# Altium footprint library ICs And Semiconductors THD.PcbLib: 507 footprints (part 32 of 32)
Each footprint in its own frame and in the unit in brackets; x right, y up, seen from the top. Pads: shape width x height; smd on the part's side, far side on the other; paste and mask are expansions set on the pad; w line width, h text height; cw(c..) or ccw(c..) is an arc to the next point about the centre after c.
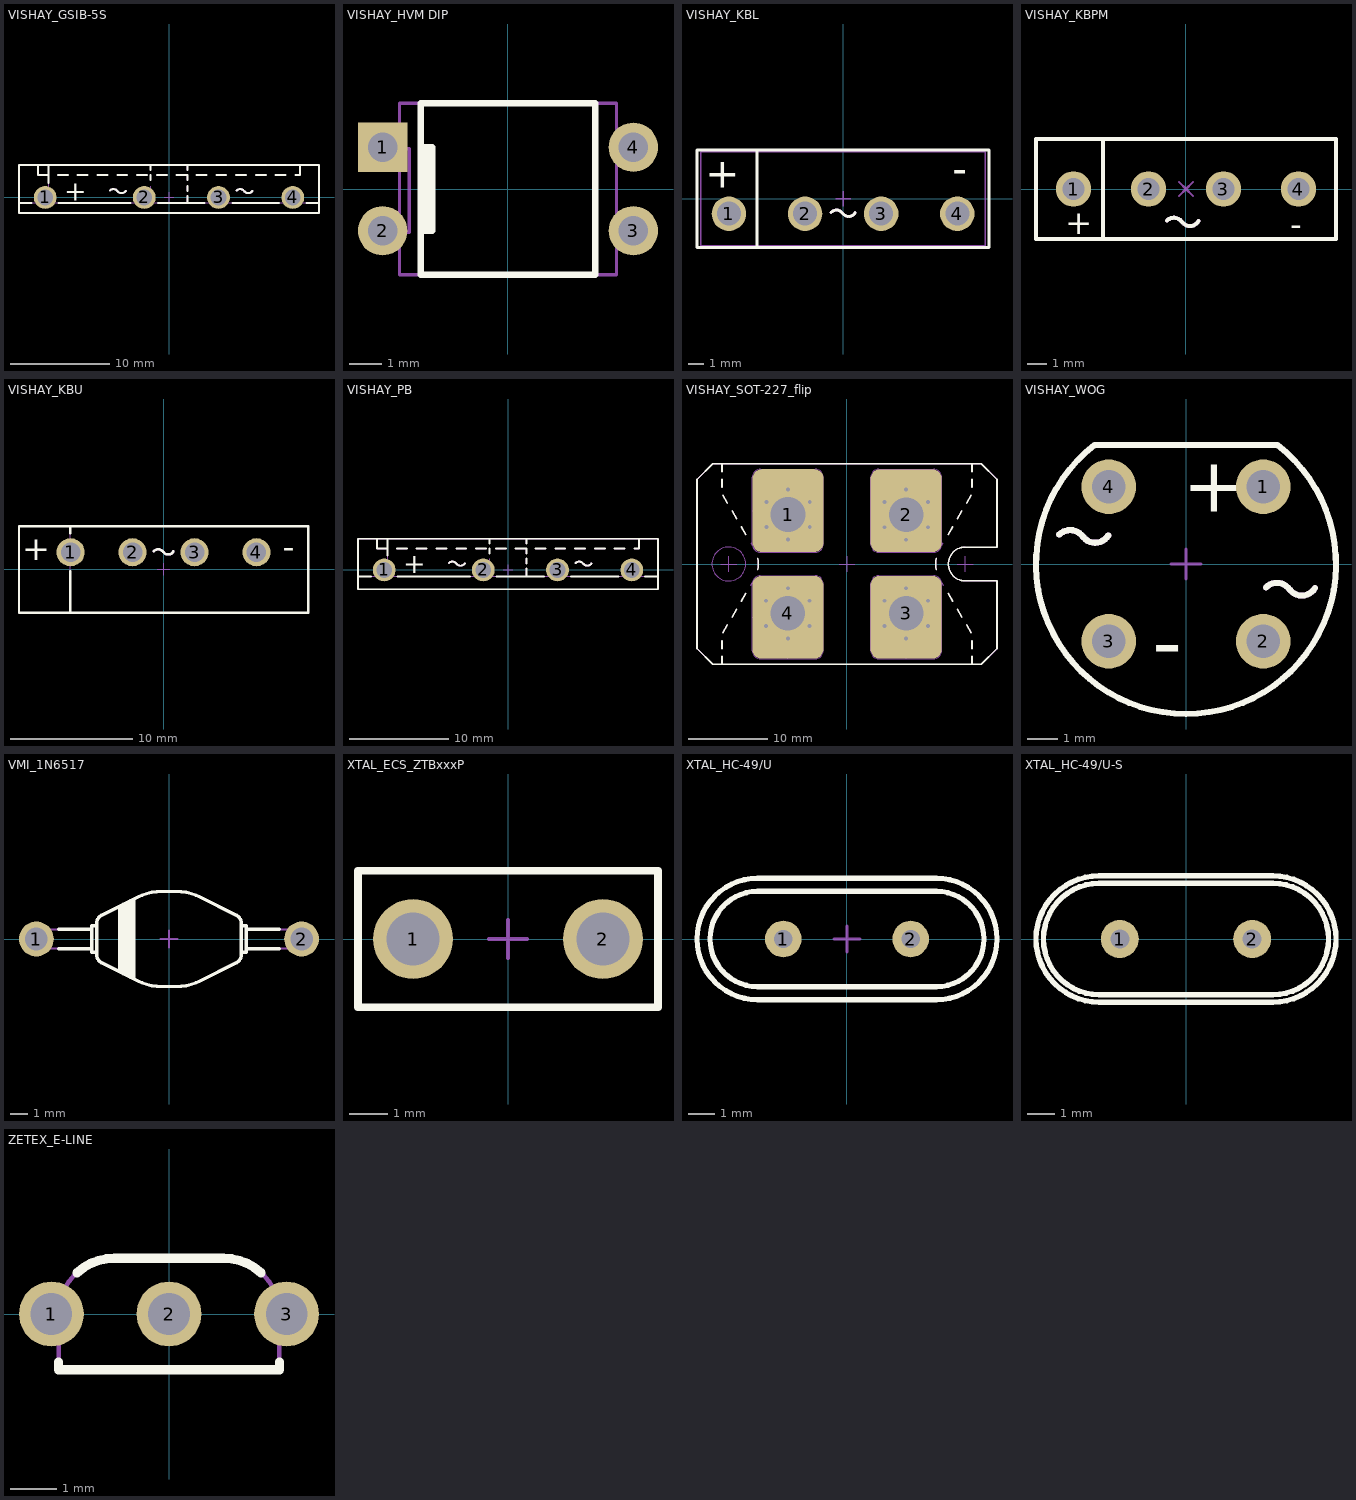
[diagram p31: the footprints below, top view; thin cyan lines are the x and y axes]

## VISHAY_GSIB-5S [mm] "Bridge Rectifier, Body 30mm x 4.8mm, VISHAY Case Type GSIB-5S"
height 24.5
pads (4):
  round 2.3 hole 1.6: 1(-12.5,0) 2(-2.5,0) 3(5,0) 4(12.5,0)
Top Overlay:
  lines w0.2: -15.15,-0.55 -13.896,-0.55 ; -13.22,3.25 -13.22,2.25 -12.22,2.25 ; -12.15,1.459 -12.15,3.25 ; -11.22,2.25 -10.22,2.25 ; -11.148,-0.55 -3.896,-0.55 ; -9.22,2.25 -8.22,2.25 ; -7.22,2.25 -6.22,2.25 ; -5.975,0.688 cw(c-5.615,0.341) -5.2,0.62 ; -5.22,2.25 -4.22,2.25 ; -5.175,0.6 ccw(c-4.794,0.923) -4.365,0.666 ; -3.22,2.25 -2.22,2.25 ; -1.85,1.75 -1.85,2.25 ; -1.85,2.75 -1.85,3.25 ; -1.22,2.25 -0.22,2.25 ; -1.104,-0.55 3.604,-0.55 ; 0.78,2.25 1.78,2.25 ; 1.85,-0.55 1.85,0.15 ; 1.85,0.65 1.85,1.15 ; 1.85,1.75 1.85,2.25 ; 1.85,2.75 1.85,3.25 ; 2.78,2.25 3.78,2.25 ; 4.78,2.25 5.78,2.25 ; 6.396,-0.55 11.104,-0.55 ; 6.78,2.25 7.78,2.25 ; 6.825,0.688 cw(c7.185,0.341) 7.6,0.62 ; 7.625,0.6 ccw(c8.006,0.923) 8.435,0.666 ; 8.78,2.25 9.78,2.25 ; 10.78,2.25 11.78,2.25 ; 12.78,2.25 13.22,2.25 13.22,3.25 ; 13.896,-0.55 15.15,-0.55 ; -15.15,-1.55 15.15,-1.55 15.15,3.25 0,3.25 -15.15,3.25 -15.15,-1.55
  text "+" at -10.575,-0.355 h2
Notvisible:
  lines w0.05: -13,0 -12.5,0 ; -12.5,-0.5 -12.5,0 ; -12.5,0.5 -12.5,0 ; -12,0 -12.5,0 ; -3,0 -2.5,0 ; -2.5,-0.5 -2.5,0 ; -2.5,0.5 -2.5,0 ; -2,0 -2.5,0 ; -0.5,0 0,0 ; 0,-0.5 0,0 ; 0,0.5 0,0 ; 0.5,0 0,0 ; 4.5,0 5,0 ; 5,-0.5 5,0 ; 5,0.5 5,0 ; 5.5,0 5,0 ; 12,0 12.5,0 ; 12.5,-0.5 12.5,0 ; 12.5,0.5 12.5,0 ; 13,0 12.5,0
Mechanical 14:
  lines w0.1: -15.15,-0.55 15.15,-0.55 ; -13.22,3.25 -13.22,2.25 -12.22,2.25 ; -12.15,-0.55 -12.15,3.25 ; -11.22,2.25 -10.22,2.25 ; -9.22,2.25 -8.22,2.25 ; -7.22,2.25 -6.22,2.25 ; -5.22,2.25 -4.22,2.25 ; -3.22,2.25 -2.22,2.25 ; -1.85,-0.55 -1.85,0.15 ; -1.85,0.65 -1.85,1.15 ; -1.85,1.75 -1.85,2.25 ; -1.85,2.75 -1.85,3.25 ; -1.22,2.25 -0.22,2.25 ; 0.78,2.25 1.78,2.25 ; 1.85,-0.55 1.85,0.15 ; 1.85,0.65 1.85,1.15 ; 1.85,1.75 1.85,2.25 ; 1.85,2.75 1.85,3.25 ; 2.78,2.25 3.78,2.25 ; 4.78,2.25 5.78,2.25 ; 6.78,2.25 7.78,2.25 ; 8.78,2.25 9.78,2.25 ; 10.78,2.25 11.78,2.25 ; 12.78,2.25 13.22,2.25 13.22,3.25 ; -15.15,-1.55 15.15,-1.55 15.15,3.25 0,3.25 -15.15,3.25 -15.15,-1.55
  lines w0.2: -5.975,0.688 cw(c-5.615,0.341) -5.2,0.62 ; -5.175,0.6 ccw(c-4.794,0.923) -4.365,0.666 ; 6.825,0.688 cw(c7.185,0.341) 7.6,0.62 ; 7.625,0.6 ccw(c8.006,0.923) 8.435,0.666
  text "+" at -10.575,-0.355 h2
3D body "VISHAY_GSIB-5S.stp": height 24.3, standoff -3.6, extent -15.15,-1.55 15.15,3.25

## VISHAY_HVM DIP [mm] "DIP 4 Leads, Row Spacing 7.62 mm; Pitch 2.54 mm"
height 4.57
pads (4):
  rect 1.5x1.5 hole 0.9: 1(-3.81,1.27)
  round 1.5 hole 0.9: 2(-3.81,-1.27) 3(3.81,-1.27) 4(3.81,1.27)
Top Overlay:
  lines w0.2: -2.4,-1.275 -2.4,1.265 ; -2.3,-1.275 -2.3,1.265 ; -2.3,-1.27 -2.51,-1.27 -2.51,1.27 -2.3,1.27 ; -2.65,-2.61 2.65,-2.61 2.65,2.61 -2.65,2.61 -2.65,-2.61
Mechanical 14:
  lines w0.1: -3.3,-1.315 -3,-1.315 -3,1.225 -3.3,1.225 ; -3.3,-2.61 -3.3,2.61 3.3,2.61 3.3,-2.61 -3.3,-2.61
3D body "VISHAY_HVM DIP.stp": height 4.57, standoff -3.3, extent -3.935,-2.54 3.935,2.54

## VISHAY_KBL [mm] "Single-Phase Bridge Rectifier, Body 19mm x 6.25mm x 16.3mm"
height 16.3
pads (4):
  round 2.3 hole 1.6: 1(-7.62,-1) 2(-2.54,-1) 3(2.54,-1) 4(7.62,-1)
Top Overlay:
  lines w0.2: -5.75,-3.248 -5.75,3.25 ; -0.8,-0.912 cw(c-0.44,-1.259) -0.025,-0.98 ; 0,-1 ccw(c0.381,-0.677) 0.81,-0.934 ; -9.75,-3.248 -9.75,3.252 9.75,3.252 9.75,-3.248 -9.75,-3.248
  text "-" at 8.27,2.55 h2
  text "+" at -6.895,2.425 h2
Notvisible:
  lines w0.1: -8.12,-1 -7.62,-1 ; -7.62,-1.5 -7.62,-1 ; -7.62,-0.5 -7.62,-1 ; -7.12,-1 -7.62,-1 ; -3.04,-1 -2.54,-1 ; -2.54,-1.5 -2.54,-1 ; -2.54,-0.5 -2.54,-1 ; -2.04,-1 -2.54,-1 ; -0.5,0 0,0 ; 0,-0.5 0,0 ; 0,0.5 0,0 ; 0.5,0 0,0 ; 2.04,-1 2.54,-1 ; 2.54,-1.5 2.54,-1 ; 2.54,-0.5 2.54,-1 ; 3.04,-1 2.54,-1 ; 7.12,-1 7.62,-1 ; 7.62,-1.5 7.62,-1 ; 7.62,-0.5 7.62,-1 ; 8.12,-1 7.62,-1 ; -9.5,-3.125 9.5,-3.125 9.5,3.125 -9.5,3.125 -9.5,-3.125
Mechanical 14:
  lines w0.1: -5.75,-3.248 -5.75,3.25 ; -9.75,-3.25 -9.75,3.25 9.75,3.25 9.75,-3.25 -9.75,-3.25
  lines w0.2: -0.8,-0.912 cw(c-0.44,-1.259) -0.025,-0.98 ; 0,-1 ccw(c0.381,-0.677) 0.81,-0.934
  text "-" at 8.27,2.55 h2
  text "+" at -6.895,2.425 h2
3D body "VISHAY_KBL.stp": height 16.3, standoff -3.8, extent -9.75,-3.25 9.75,3.25

## VISHAY_KBPM [mm] "Bridge Rectifier, Body 14.73mm x 2.41mm, VISHAY Case Type KBPM"
height 12.7
pads (4):
  round 1.8 hole 1.1: 1(-5.715,0) 2(-1.905,0) 3(1.905,0) 4(5.715,0)
Top Overlay:
  lines w0.2: -4.213,-2.54 -4.213,2.54 ; -0.975,-1.612 cw(c-0.615,-1.959) -0.2,-1.68 ; -0.175,-1.7 ccw(c0.206,-1.377) 0.635,-1.634 ; -7.62,-2.54 -7.62,2.54 7.62,2.54 7.62,-2.54 -7.62,-2.54
  text "+" at -6.125,-2.31 h1.2
  text "-" at 5.305,-2.38 h1.2
Notvisible:
  lines w0.1: -6.215,0 -5.715,0 ; -5.715,-0.5 -5.715,0 ; -5.715,0.5 -5.715,0 ; -5.215,0 -5.715,0 ; -2.405,0 -1.905,0 ; -1.905,-0.5 -1.905,0 ; -1.905,0.5 -1.905,0 ; -1.405,0 -1.905,0 ; -0.354,-0.354 0,0 ; -0.354,0.354 0,0 ; 0.354,-0.354 0,0 ; 0.354,0.354 0,0 ; 1.405,0 1.905,0 ; 1.905,-0.5 1.905,0 ; 1.905,0.5 1.905,0 ; 2.405,0 1.905,0 ; 5.215,0 5.715,0 ; 5.715,-0.5 5.715,0 ; 5.715,0.5 5.715,0 ; 6.215,0 5.715,0
Mechanical 14:
  lines w0.1: -4.213,-2.54 -4.213,2.54 ; -7.62,-2.54 -7.62,2.54 7.62,2.54 7.62,-2.54 -7.62,-2.54
  lines w0.2: -0.975,-1.612 cw(c-0.615,-1.959) -0.2,-1.68 ; -0.175,-1.7 ccw(c0.206,-1.377) 0.635,-1.634
  text "+" at -6.125,-2.31 h1.2
  text "-" at 5.305,-2.38 h1.2
3D body "VISHAY_KBPM.stp": height 12.7, standoff -3.58, extent -7.62,-2.54 7.62,2.54

## VISHAY_KBU [mm] "Single-Phase Bridge Rectifier, Body 23.2mm x 6.85mm"
height 19.3
pads (4):
  round 2.3 hole 1.6: 1(-7.62,1.4) 2(-2.54,1.4) 3(2.54,1.4) 4(7.62,1.4)
Top Overlay:
  lines w0.2: -7.65,-3.55 -7.65,-0.15 ; -7.65,2.95 -7.65,3.55 ; -0.8,1.488 cw(c-0.44,1.141) -0.025,1.42 ; 0,1.4 ccw(c0.381,1.723) 0.81,1.466 ; -11.85,-3.55 11.85,-3.55 11.85,3.55 -11.85,3.55 -11.85,-3.55
  text "+" at -9.27,2.425 h2
  text "-" at 10.745,2.4 h2
Notvisible:
  lines w0.1: -8.12,1.4 -7.62,1.4 ; -7.62,0.9 -7.62,1.4 ; -7.62,1.9 -7.62,1.4 ; -7.12,1.4 -7.62,1.4 ; -3.04,1.4 -2.54,1.4 ; -2.54,0.9 -2.54,1.4 ; -2.54,1.9 -2.54,1.4 ; -2.04,1.4 -2.54,1.4 ; -0.5,0 0,0 ; 0,-0.5 0,0 ; 0,0.5 0,0 ; 0.5,0 0,0 ; 2.04,1.4 2.54,1.4 ; 2.54,0.9 2.54,1.4 ; 2.54,1.9 2.54,1.4 ; 3.04,1.4 2.54,1.4 ; 7.12,1.4 7.62,1.4 ; 7.62,0.9 7.62,1.4 ; 7.62,1.9 7.62,1.4 ; 8.12,1.4 7.62,1.4
Mechanical 14:
  lines w0.1: -7.65,-3.55 -7.65,3.55 ; -11.85,-3.55 11.85,-3.55 11.85,3.55 -11.85,3.55 -11.85,-3.55
  lines w0.2: -0.8,1.488 cw(c-0.44,1.141) -0.025,1.42 ; 0,1.4 ccw(c0.381,1.723) 0.81,1.466
  text "+" at -9.27,2.425 h2
  text "-" at 10.745,2.4 h2
3D body "VISHAY_KBU.stp": height 19.29, standoff -3.8, extent -11.85,-3.55 11.85,3.55

## VISHAY_PB [mm] "Bridge Rectifier, Body 30mm x 4.8mm, VISHAY Case Type PB"
height 24.45
pads (4):
  round 2.3 hole 1.6: 1(-12.5,0) 2(-2.5,0) 3(5,0) 4(12.5,0)
Top Overlay:
  lines w0.2: -15.15,-0.65 -13.852,-0.65 ; -13.22,3.15 -13.22,2.15 -12.22,2.15 ; -12.15,1.459 -12.15,3.15 ; -11.22,2.15 -10.22,2.15 ; -11.148,-0.65 -3.852,-0.65 ; -9.22,2.15 -8.22,2.15 ; -7.22,2.15 -6.22,2.15 ; -5.975,0.688 cw(c-5.615,0.341) -5.2,0.62 ; -5.22,2.15 -4.22,2.15 ; -5.175,0.6 ccw(c-4.794,0.923) -4.365,0.666 ; -3.22,2.15 -2.22,2.15 ; -1.85,1.65 -1.85,2.15 ; -1.85,2.65 -1.85,3.15 ; -1.22,2.15 -0.22,2.15 ; -1.148,-0.65 3.648,-0.65 ; 0.78,2.15 1.78,2.15 ; 1.85,-0.65 1.85,0.15 ; 1.85,0.65 1.85,1.15 ; 1.85,1.65 1.85,2.15 ; 1.85,2.65 1.85,3.15 ; 2.78,2.15 3.78,2.15 ; 4.78,2.15 5.78,2.15 ; 6.352,-0.65 11.148,-0.65 ; 6.78,2.15 7.78,2.15 ; 6.825,0.688 cw(c7.185,0.341) 7.6,0.62 ; 7.625,0.6 ccw(c8.006,0.923) 8.435,0.666 ; 8.78,2.15 9.78,2.15 ; 10.78,2.15 11.78,2.15 ; 12.78,2.15 13.22,2.15 13.22,3.15 ; 13.852,-0.65 15.15,-0.65 ; -15.15,-1.95 -15.15,3.15 0,3.15 15.15,3.15 15.15,-1.95 -15.15,-1.95
  text "+" at -10.575,-0.355 h2
Notvisible:
  lines w0.1: -13,0 -12.5,0 ; -12.5,-0.5 -12.5,0 ; -12.5,0.5 -12.5,0 ; -12,0 -12.5,0 ; -3,0 -2.5,0 ; -2.5,-0.5 -2.5,0 ; -2.5,0.5 -2.5,0 ; -2,0 -2.5,0 ; -0.5,0 0,0 ; 0,-0.5 0,0 ; 0,0.5 0,0 ; 0.5,0 0,0 ; 4.5,0 5,0 ; 5,-0.5 5,0 ; 5,0.5 5,0 ; 5.5,0 5,0 ; 12,0 12.5,0 ; 12.5,-0.5 12.5,0 ; 12.5,0.5 12.5,0 ; 13,0 12.5,0
Mechanical 14:
  lines w0.1: -15.15,-0.65 15.15,-0.65 ; -13.22,3.15 -13.22,2.15 -12.22,2.15 ; -12.15,-0.65 -12.15,3.15 ; -11.22,2.15 -10.22,2.15 ; -9.22,2.15 -8.22,2.15 ; -7.22,2.15 -6.22,2.15 ; -5.22,2.15 -4.22,2.15 ; -3.22,2.15 -2.22,2.15 ; -1.85,-0.65 -1.85,0.15 ; -1.85,0.65 -1.85,1.15 ; -1.85,1.65 -1.85,2.15 ; -1.85,2.65 -1.85,3.15 ; -1.22,2.15 -0.22,2.15 ; 0.78,2.15 1.78,2.15 ; 1.85,-0.65 1.85,0.15 ; 1.85,0.65 1.85,1.15 ; 1.85,1.65 1.85,2.15 ; 1.85,2.65 1.85,3.15 ; 2.78,2.15 3.78,2.15 ; 4.78,2.15 5.78,2.15 ; 6.78,2.15 7.78,2.15 ; 8.78,2.15 9.78,2.15 ; 10.78,2.15 11.78,2.15 ; 12.78,2.15 13.22,2.15 13.22,3.15 ; -15.15,-1.95 -15.15,3.15 0,3.15 15.15,3.15 15.15,-1.95 -15.15,-1.95
  lines w0.2: -5.975,0.688 cw(c-5.615,0.341) -5.2,0.62 ; -5.175,0.6 ccw(c-4.794,0.923) -4.365,0.666 ; 6.825,0.688 cw(c7.185,0.341) 7.6,0.62 ; 7.625,0.6 ccw(c8.006,0.923) 8.435,0.666
  text "+" at -10.575,-0.355 h2
3D body "VISHAY_PB.stp": height 29.3, standoff -4, extent -15.15,-1.95 15.15,3.15

## VISHAY_SOT-227_flip [mm] "VISHAY SOT-227 Case, Body 38.3mm x 25.7mm, Screws on PCB Version"
height 5.6
pads (4):
  rrect25% 9x10.5 hole 4.4 copper offset 0,0.5: 1(-7.475,6.275) 2(7.5,6.25)
  rrect25% 9x10.5 hole 4.4 copper offset 0,-0.5: 3(7.5,-6.25) 4(-7.5,-6.25)
via 10.25,4.663 diameter 1 hole 0.5
via 7.5,3.075 diameter 1 hole 0.5
via 4.75,4.663 diameter 1 hole 0.5
via 4.75,7.838 diameter 1 hole 0.5
via 7.5,9.425 diameter 1 hole 0.5
via 10.25,7.838 diameter 1 hole 0.5
via -4.725,7.862 diameter 1 hole 0.5
via -7.475,9.45 diameter 1 hole 0.5
via -10.225,7.862 diameter 1 hole 0.5
via -10.225,4.687 diameter 1 hole 0.5
via -7.475,3.1 diameter 1 hole 0.5
via -4.725,4.687 diameter 1 hole 0.5
via -10.25,-7.838 diameter 1 hole 0.5
via -7.5,-9.425 diameter 1 hole 0.5
via -4.75,-7.838 diameter 1 hole 0.5
via -4.75,-4.663 diameter 1 hole 0.5
via -7.5,-3.075 diameter 1 hole 0.5
via -10.25,-4.663 diameter 1 hole 0.5
via 4.75,-7.838 diameter 1 hole 0.5
via 7.5,-9.425 diameter 1 hole 0.5
via 10.25,-7.838 diameter 1 hole 0.5
via 10.25,-4.663 diameter 1 hole 0.5
via 7.5,-3.075 diameter 1 hole 0.5
via 4.75,-4.663 diameter 1 hole 0.5
Top Overlay:
  lines w0.2: -15.85,-12.725 -15.85,-11.725 ; -15.85,-10.725 -15.85,-9.725 ; -15.85,9.725 -15.85,10.725 ; -15.85,11.725 -15.85,12.725 ; -15.747,-8.725 -15.162,-7.725 ; -15.747,8.725 -15.162,7.725 ; -14.576,-6.725 -13.991,-5.725 ; -14.576,6.725 -13.991,5.725 ; -13.405,-4.725 -12.82,-3.725 ; -13.405,4.725 -12.82,3.725 ; -11.316,-0.725 ccw(c-15.073,0) -11.316,0.725 ; 11.319,-0.725 cw(c15.1,0) 11.319,0.725 ; 12.82,-3.725 13.405,-4.725 ; 12.82,3.725 13.405,4.725 ; 13.991,-5.725 14.576,-6.725 ; 13.991,5.725 14.576,6.725 ; 15.162,-7.725 15.748,-8.725 ; 15.162,7.725 15.748,8.725 ; 15.85,-12.725 15.85,-11.725 ; 15.85,-10.725 15.85,-9.725 ; 15.85,9.725 15.85,10.725 ; 15.85,11.725 15.85,12.725 ; -19.025,-10.725 -17.025,-12.725 17.025,-12.725 19.025,-10.725 19.025,-2.15 15,-2.15 cw(c15,0) 15,2.15 19.025,2.15 19.025,10.725 17.025,12.725 -17.025,12.725 -19.025,10.725 -19.025,-10.725
Notvisible:
  lines w0.1: -16,0 -15,0 ; -15,-1 -15,0 ; -15,1 -15,0 ; -14,0 -15,0 ; -12,-6.75 -7.5,-6.75 ; -12,6.75 -7.5,6.75 ; -8.207,-6.957 -7.5,-6.25 ; -8.207,-5.543 -7.5,-6.25 ; -8.207,5.543 -7.5,6.25 ; -8.207,6.957 -7.5,6.25 ; -7.5,-12 -7.5,-6.75 ; -7.5,-1.5 -7.5,-6.75 ; -7.5,1.5 -7.5,6.75 ; -7.5,12 -7.5,6.75 ; -6.793,-6.957 -7.5,-6.25 ; -6.793,-5.543 -7.5,-6.25 ; -6.793,5.543 -7.5,6.25 ; -6.793,6.957 -7.5,6.25 ; -3,-6.75 -7.5,-6.75 ; -3,6.75 -7.5,6.75 ; -1,0 0,0 ; 0,-1 0,0 ; 0,1 0,0 ; 1,0 0,0 ; 3,-6.75 7.5,-6.75 ; 3,6.75 7.5,6.75 ; 6.793,-6.957 7.5,-6.25 ; 6.793,-5.543 7.5,-6.25 ; 6.793,5.543 7.5,6.25 ; 6.793,6.957 7.5,6.25 ; 7.5,-12 7.5,-6.75 ; 7.5,-1.5 7.5,-6.75 ; 7.5,1.5 7.5,6.75 ; 7.5,12 7.5,6.75 ; 8.207,-6.957 7.5,-6.25 ; 8.207,-5.543 7.5,-6.25 ; 8.207,5.543 7.5,6.25 ; 8.207,6.957 7.5,6.25 ; 12,-6.75 7.5,-6.75 ; 12,6.75 7.5,6.75 ; 14,0 15,0 ; 15,-1 15,0 ; 15,1 15,0 ; 16,0 15,0 ; -12,-11 ccw(c-11,-11) -11,-12 -4,-12 ccw(c-4,-11) -3,-11 -3,-2.5 ccw(c-4,-2.5) -4,-1.5 -11,-1.5 ccw(c-11,-2.5) -12,-2.5 -12,-11 ; -12,2.5 ccw(c-11,2.5) -11,1.5 -4,1.5 ccw(c-4,2.5) -3,2.5 -3,11 ccw(c-4,11) -4,12 -11,12 ccw(c-11,11) -12,11 -12,2.5 ; 3,-11 ccw(c4,-11) 4,-12 11,-12 ccw(c11,-11) 12,-11 12,-2.5 ccw(c11,-2.5) 11,-1.5 4,-1.5 ccw(c4,-2.5) 3,-2.5 3,-11 ; 3,2.5 ccw(c4,2.5) 4,1.5 11,1.5 ccw(c11,2.5) 12,2.5 12,11 ccw(c11,11) 11,12 4,12 ccw(c4,11) 3,11 3,2.5
Mechanical 14:
  circle w0.1: c-15,0 r2.15
  lines w0.1: -15.85,-12.725 -15.85,-11.725 ; -15.85,-10.725 -15.85,-9.725 ; -15.85,9.725 -15.85,10.725 ; -15.85,11.725 -15.85,12.725 ; -15.747,-8.725 -15.162,-7.725 ; -15.747,8.725 -15.162,7.725 ; -14.576,-6.725 -13.991,-5.725 ; -14.576,6.725 -13.991,5.725 ; -13.405,-4.725 -12.82,-3.725 ; -13.405,4.725 -12.82,3.725 ; -12.234,-2.725 -11.778,-1.945 ccw(c-15.073,0) -11.657,-1.725 ; -12.234,2.725 -11.778,1.945 cw(c-15.073,0) -11.657,1.725 ; -11.316,-0.725 ccw(c-15.073,0) -11.316,0.725 ; 11.319,-0.725 cw(c15.1,0) 11.319,0.725 ; 11.658,-1.725 ccw(c15.1,0) 11.778,-1.945 12.234,-2.725 ; 11.658,1.725 cw(c15.1,0) 11.778,1.945 12.234,2.725 ; 12.82,-3.725 13.405,-4.725 ; 12.82,3.725 13.405,4.725 ; 13.991,-5.725 14.576,-6.725 ; 13.991,5.725 14.576,6.725 ; 15.162,-7.725 15.748,-8.725 ; 15.162,7.725 15.748,8.725 ; 15.85,-12.725 15.85,-11.725 ; 15.85,-10.725 15.85,-9.725 ; 15.85,9.725 15.85,10.725 ; 15.85,11.725 15.85,12.725 ; -19.025,-10.725 -17.025,-12.725 17.025,-12.725 19.025,-10.725 19.025,-2.15 15,-2.15 cw(c15,0) 15,2.15 19.025,2.15 19.025,10.725 17.025,12.725 -17.025,12.725 -19.025,10.725 -19.025,-10.725
3D body "VISHAY_SOT-227_flip.stp": height 12.3, standoff 0, extent -19.025,-12.725 19.025,12.725

## VISHAY_WOG [mm] "Bridge Rectifier, Body 9.35m x 8.33mm, VISHAY Case Type WOG"
height 5.6
pads (4):
  round 1.8 hole 1.1: 1(2.54,2.54) 2(2.54,-2.54) 3(-2.54,-2.54) 4(-2.54,2.54)
Top Overlay:
  lines w0.2: -4.165,0.963 cw(c-3.805,0.616) -3.39,0.895 ; -3.365,0.875 ccw(c-2.984,1.198) -2.555,0.941 ; 2.625,-0.772 cw(c2.985,-1.119) 3.4,-0.84 ; 3.425,-0.86 ccw(c3.806,-0.537) 4.235,-0.794 ; -3.003,3.91 ccw(c0,0) 3.003,3.91 -3.003,3.91
  text "-" at -1.105,-3.52 h2
  text "+" at -0.1,1.72 h1.8
Notvisible:
  lines w0.1: -3.04,-2.54 -2.54,-2.54 ; -3.04,2.54 -2.54,2.54 ; -2.54,-3.04 -2.54,-2.54 ; -2.54,-2.04 -2.54,-2.54 ; -2.54,2.04 -2.54,2.54 ; -2.54,3.04 -2.54,2.54 ; -2.04,-2.54 -2.54,-2.54 ; -2.04,2.54 -2.54,2.54 ; -0.5,0 0,0 ; 0,-0.5 0,0 ; 0,0.5 0,0 ; 0.5,0 0,0 ; 2.04,-2.54 2.54,-2.54 ; 2.04,2.54 2.54,2.54 ; 2.54,-3.04 2.54,-2.54 ; 2.54,-2.04 2.54,-2.54 ; 2.54,2.04 2.54,2.54 ; 2.54,3.04 2.54,2.54 ; 3.04,-2.54 2.54,-2.54 ; 3.04,2.54 2.54,2.54
Mechanical 14:
  lines w0.1: -3.003,3.91 ccw(c0,0) 3.003,3.91 -3.003,3.91
  lines w0.2: -4.165,0.963 cw(c-3.805,0.616) -3.39,0.895 ; -3.365,0.875 ccw(c-2.984,1.198) -2.555,0.941 ; 2.625,-0.772 cw(c2.985,-1.119) 3.4,-0.84 ; 3.425,-0.86 ccw(c3.806,-0.537) 4.235,-0.794
  text "-" at -1.105,-3.52 h2
  text "+" at -0.1,1.72 h1.8
3D body "VISHAY_WOG.stp": height 13.5, standoff -3.2, extent -4.928,-4.93 4.928,3.91

## VMI_1N6517 [mm] "DO-201AD, Diode, Axial; Lead Spacing 15.24mm, Lead Dia. 1mm, Body Length 8.89mm, Body Dia. 5.46mm"
height 5.46
pads (2):
  round 2 hole 1.3: 1(-7.62,0) 2(7.62,0)
Top Overlay:
  lines w0.2: -6.333,-0.55 -4.445,-0.55 ; -6.333,0.55 -4.445,0.55 ; -4.145,-0.75 -4.445,-0.75 -4.445,0.75 -4.145,0.75 ; -2.824,-1.891 -2.824,1.891 ; -2.624,-1.991 -2.624,1.991 ; -2.424,-2.091 -2.424,2.091 ; -2.224,-2.191 -2.224,2.191 ; -2.024,-2.291 -2.024,2.291 ; 4.145,-0.75 4.445,-0.75 4.445,0.75 4.145,0.75 ; 4.445,-0.55 6.333,-0.55 ; 4.445,0.55 6.333,0.55 ; -4.145,-0.921 ccw(c-3.645,-0.921) -3.869,-1.368 -1.778,-2.413 ccw(c-0.437,0.27) -0.437,-2.73 0.437,-2.73 ccw(c0.437,0.27) 1.778,-2.413 3.869,-1.368 ccw(c3.645,-0.921) 4.145,-0.921 4.145,0.921 ccw(c3.645,0.921) 3.869,1.368 1.778,2.413 ccw(c0.437,-0.27) 0.437,2.73 -0.437,2.73 ccw(c-0.437,-0.27) -1.778,2.413 -3.869,1.368 ccw(c-3.645,0.921) -4.145,0.921 -4.145,-0.921
Notvisible:
  lines w0.1: -8.12,0 -7.62,0 ; -7.62,-0.5 -7.62,0 ; -7.62,0.5 -7.62,0 ; -7.12,0 -7.62,0 ; -0.5,0 0,0 ; 0,-0.5 0,0 ; 0,0.5 0,0 ; 0.5,0 0,0 ; 7.12,0 7.62,0 ; 7.62,-0.5 7.62,0 ; 7.62,0.5 7.62,0 ; 8.12,0 7.62,0
Mechanical 14:
  lines w0.1: -4.445,-0.55 -7.62,-0.55 cw(c-7.62,0) -7.62,0.55 -4.445,0.55 ; -4.145,-0.75 -4.445,-0.75 -4.445,0.75 -4.145,0.75 ; -2.824,-1.891 -2.824,1.891 ; -2.624,-1.991 -2.624,1.991 ; -2.424,-2.091 -2.424,2.091 ; -2.224,-2.191 -2.224,2.191 ; -2.024,-2.291 -2.024,2.291 ; 4.145,-0.75 4.445,-0.75 4.445,0.75 4.145,0.75 ; 4.445,-0.55 7.62,-0.55 ccw(c7.62,0) 7.62,0.55 4.445,0.55 ; -4.145,-0.921 ccw(c-3.645,-0.921) -3.869,-1.368 -1.778,-2.413 ccw(c-0.437,0.27) -0.437,-2.73 0.437,-2.73 ccw(c0.437,0.27) 1.778,-2.413 3.869,-1.368 ccw(c3.645,-0.921) 4.145,-0.921 4.145,0.921 ccw(c3.645,0.921) 3.869,1.368 1.778,2.413 ccw(c0.437,-0.27) 0.437,2.73 -0.437,2.73 ccw(c-0.437,-0.27) -1.778,2.413 -3.869,1.368 ccw(c-3.645,0.921) -4.145,0.921 -4.145,-0.921
3D body "VMI_1N6517.stp": height 5.46, standoff -3.6, extent -8.17,-2.73 8.17,2.73

## XTAL_ECS_ZTBxxxP [mm] "ZTB Serie Leaded Ceramic Resonator, Body L 7.9 x W 3.6mm H 9.3, Pitch 5mm"
height 9.3
pads (2):
  round 2.1 hole 1.4: 1(-2.5,0) 2(2.5,0)
Top Overlay:
  lines w0.2: -3.95,-1.8 3.95,-1.8 3.95,1.8 -3.95,1.8 -3.95,-1.8
Notvisible:
  lines w0.1: -3,0 -2.5,0 ; -2.5,-0.5 -2.5,0 ; -2.5,0.5 -2.5,0 ; -2,0 -2.5,0 ; -0.5,0 0,0 ; 0,-0.5 0,0 ; 0,0.5 0,0 ; 0.5,0 0,0 ; 2,0 2.5,0 ; 2.5,-0.5 2.5,0 ; 2.5,0.5 2.5,0 ; 3,0 2.5,0
Mechanical 14:
  lines w0.1: -3.95,-1.8 -3.95,1.8 3.95,1.8 3.95,-1.8 -3.95,-1.8
3D body "XTAL_ECS_ZTBxxxP.stp": height 9.3, standoff -3.6, extent -3.95,-1.8 3.95,1.8

## XTAL_HC-49/U [mm] "HC-49/U Leaded Cristal, Body 11.05x4.8mm; Pitch 4.88mm"
height 13.6
pads (2):
  round 1.4 hole 0.7: 1(-2.44,0) 2(2.44,0)
Top Overlay:
  lines w0.2: -5.75,0 cw(c-3.42,0) -3.42,2.33 3.42,2.33 cw(c3.42,0) 5.75,0 cw(c3.42,0) 3.42,-2.33 -3.42,-2.33 cw(c-3.42,0) -5.75,0 ; -5.25,0 cw(c-3.42,0) -3.42,1.83 3.42,1.83 cw(c3.42,0) 5.25,0 cw(c3.42,0) 3.42,-1.83 -3.42,-1.83 cw(c-3.42,0) -5.25,0
Notvisible:
  lines w0.1: -2.94,0 -2.44,0 ; -2.44,-0.5 -2.44,0 ; -2.44,0.5 -2.44,0 ; -1.94,0 -2.44,0 ; -0.5,0 0,0 ; 0,-0.5 0,0 ; 0,0.5 0,0 ; 0.5,0 0,0 ; 1.94,0 2.44,0 ; 2.44,-0.5 2.44,0 ; 2.44,0.5 2.44,0 ; 2.94,0 2.44,0
Mechanical 14:
  lines w0.1: -5.75,0 cw(c-3.42,0) -3.42,2.33 3.42,2.33 cw(c3.42,0) 5.75,0 cw(c3.42,0) 3.42,-2.33 -3.42,-2.33 cw(c-3.42,0) -5.75,0 ; -5.25,0 cw(c-3.42,0) -3.42,1.83 3.42,1.83 cw(c3.42,0) 5.25,0 cw(c3.42,0) 3.42,-1.83 -3.42,-1.83 cw(c-3.42,0) -5.25,0
3D body "XTAL_CITIZEN_HC-49-U-S.stp": height 3.5, standoff -3.6, extent -5.75,-2.33 5.75,2.33

## XTAL_HC-49/U-S [mm] "HC-49/U-S Leaded Cristal, Body 11.5x4.66mm; Pitch 4.88mm"
height 3.5
pads (2):
  round 1.4 hole 0.7: 1(-2.44,0) 2(2.44,0)
Top Overlay:
  lines w0.2: -3.2,-2.325 cw(c-3.2,0) -3.2,2.325 3.2,2.325 cw(c3.2,0) 3.2,-2.325 -3.2,-2.325 ; -3.2,-2.05 cw(c-3.2,0) -3.2,2.05 3.2,2.05 cw(c3.2,0) 3.2,-2.05 -3.2,-2.05
Mechanical 14:
  lines w0.1: -3.2,-2.325 cw(c-3.2,0) -3.2,2.325 3.2,2.325 cw(c3.2,0) 3.2,-2.325 -3.2,-2.325 ; -3.2,-2.05 cw(c-3.2,0) -3.2,2.05 3.2,2.05 cw(c3.2,0) 3.2,-2.05 -3.2,-2.05
3D body "XTAL_HC-49-U.stp": height 13.6, standoff -3.6, extent -5.525,-2.4 5.525,2.4

## ZETEX_E-LINE [mm] "E-Line Case, Pitch 2.54mm, Flat Index, 3 In-Line, Bent Leads, Body 4.57mm x 2.28mm"
height 8.78
pads (3):
  round 1.4 hole 0.9: 1(-2.54,0) 2(0,0) 3(2.54,0)
Top Overlay:
  lines w0.2: -2.385,-1.038 -2.385,-1.205 2.385,-1.205 2.385,-1.038 ; -1.989,0.894 cw(c-1.18,0) -1.18,1.205 1.18,1.205 cw(c1.18,0) 1.989,0.894
Notvisible:
  lines w0.1: -3.04,0 -2.54,0 ; -2.54,-0.5 -2.54,0 ; -2.54,0.5 -2.54,0 ; -2.04,0 -2.54,0 ; -0.5,0 0,0 ; 0,-0.5 0,0 ; 0,0.5 0,0 ; 0.5,0 0,0 ; 2.04,0 2.54,0 ; 2.54,-0.5 2.54,0 ; 2.54,0.5 2.54,0 ; 3.04,0 2.54,0
Mechanical 14:
  lines w0.1: -2.385,-0.225 -2.765,-0.225 -2.765,0.225 -2.364,0.225 ; 2.364,0.225 2.765,0.225 2.765,-0.225 2.385,-0.225 ; -2.385,-1.205 2.385,-1.205 2.385,0 ccw(c1.18,0) 1.18,1.205 -1.18,1.205 ccw(c-1.18,0) -2.385,0 -2.385,-1.205
3D body "ZETEX_E-LINE.stp": height 8.01, standoff -3.2, extent -2.765,-1.205 2.765,1.205